# Altium footprint library Custom_Library.PcbLib: 221 footprints (part 7 of 14)
Each footprint in its own frame and in the unit in brackets; x right, y up, seen from the top. Pads: shape width x height; smd on the part's side, far side on the other; paste and mask are expansions set on the pad; w line width, h text height; cw(c..) or ccw(c..) is an arc to the next point about the centre after c.
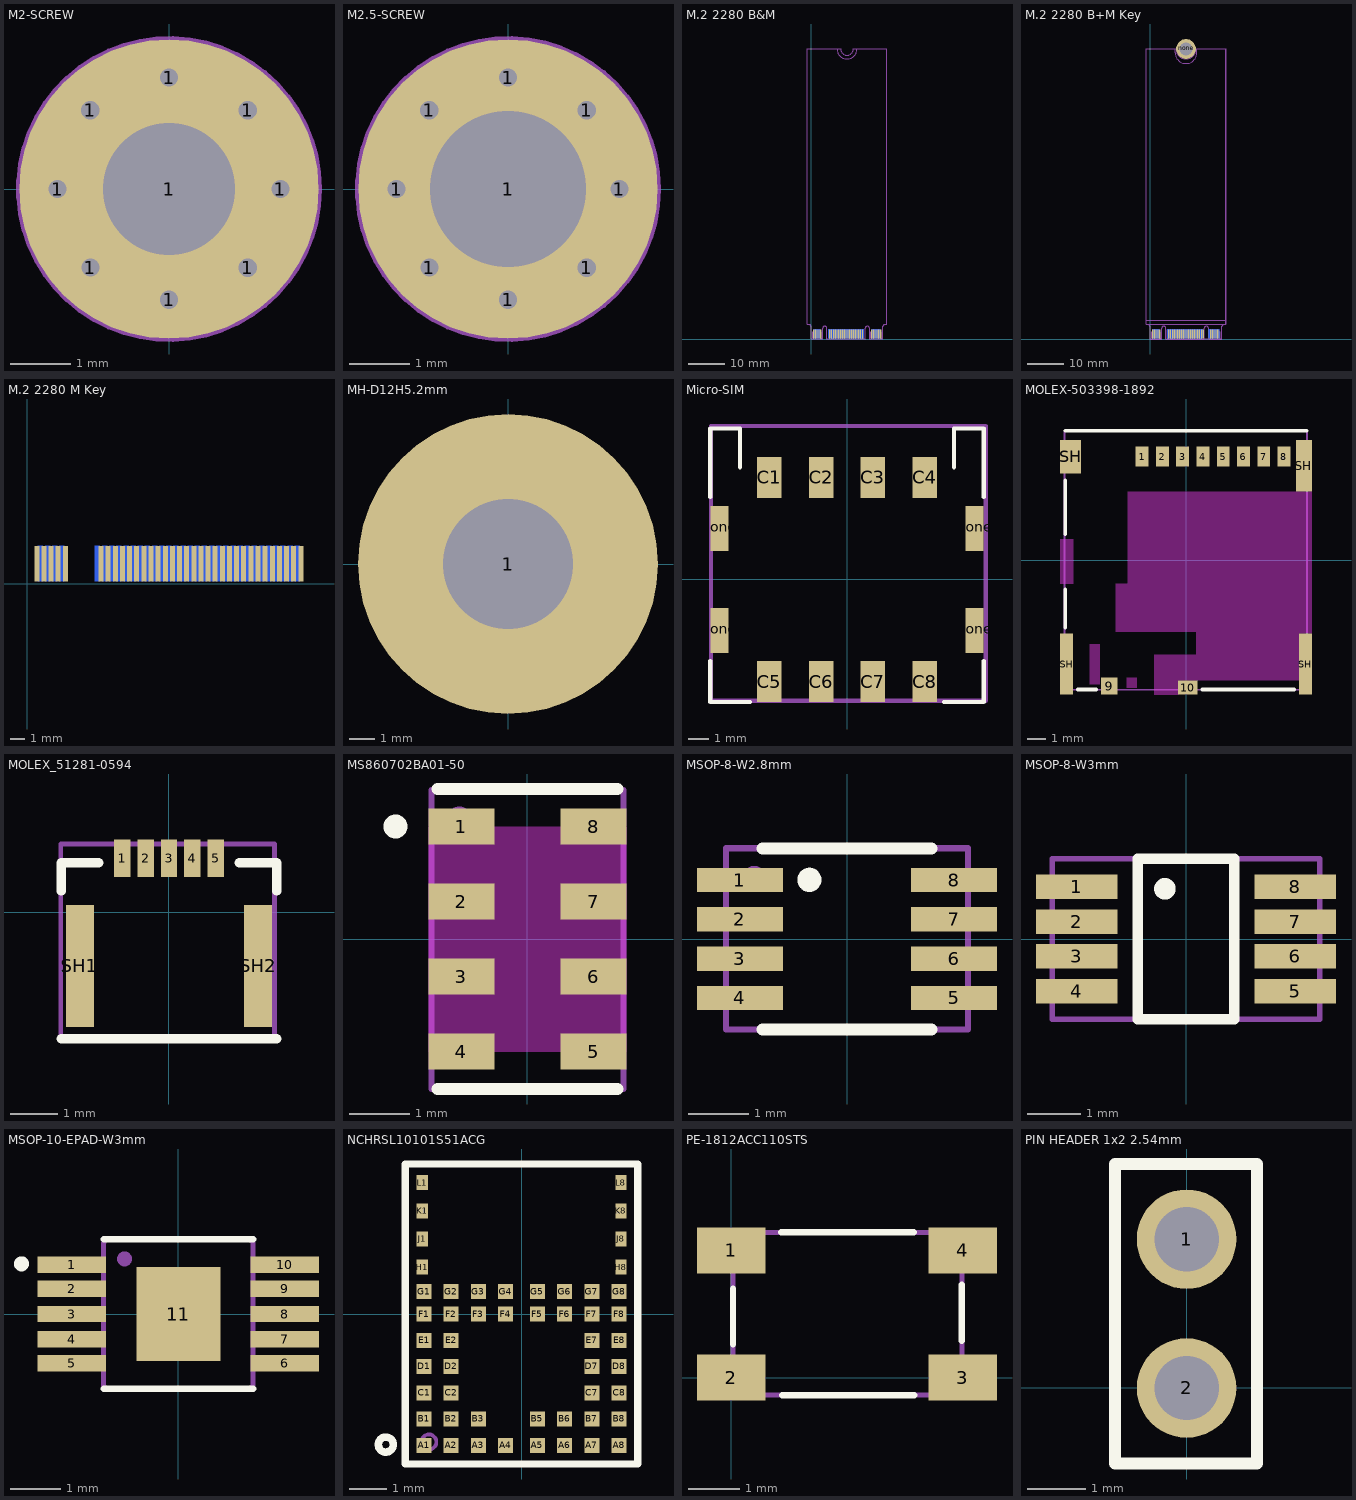
[diagram p6: the footprints below, top view; thin cyan lines are the x and y axes]

## M2-SCREW [mil]
pads (9):
  round 20 hole 12 mask+0: 1(-73.23,0) 1(-51.77,51.77) 1(-51.67,-51.67) 1(0,-72.83) 1(0,73.23) 1(51.78,-51.78) 1(51.78,51.78) 1(73.23,0)
  round 196.85 hole 86.61 mask+0: 1(0,0)
Top Assembly:
  circle w3.94: c0,0 r98.61
  lines w3.94: -98.03,0 0,0 ; 0,-98.43 0,0 ; 0,98.03 0,0 ; 98.61,0 0,0
  text "'.Designator'" at -99.78,-132.6 h39.37

## M2.5-SCREW [mil]
pads (9):
  round 20 hole 12 mask+0: 1(-73.23,0) 1(-51.77,51.77) 1(-51.67,-51.67) 1(0,-72.83) 1(0,73.23) 1(51.78,-51.78) 1(51.78,51.78) 1(73.23,0)
  round 196.85 hole 102.36 mask+0: 1(0,0)
Top Assembly:
  circle w3.94: c0,0 r98.61
  lines w3.94: -98.03,0 0,0 ; 0,-98.43 0,0 ; 0,98.03 0,0 ; 98.61,0 0,0
  text "'.Designator'" at -99.78,-132.6 h39.37

## M.2 2280 B&M [mm]
pads (59):
  rect 0.35x2.5 smd paste+0 mask+0: 1(19.2,1.4) 3(18.675,1.4) 5(18.175,1.4) 7(17.675,1.4) 9(17.175,1.4) 11(16.675,1.4) 21(14.175,1.4) 23(13.675,1.4) 25(13.175,1.4) 27(12.675,1.4) 29(12.175,1.4) 31(11.675,1.4) 33(11.175,1.4) 35(10.675,1.4) 37(10.175,1.4) 39(9.675,1.4) 41(9.175,1.4) 43(8.675,1.4) 45(8.175,1.4) 47(7.675,1.4) 49(7.175,1.4) 51(6.675,1.4) 53(6.175,1.4) 55(5.675,1.4) 57(5.175,1.4) 67(2.675,1.4) 69(2.175,1.4) 71(1.675,1.4) 73(1.175,1.4) 75(0.675,1.4)
  rect 0.35x2.5 smd far side paste+0 mask+0: 2(18.925,1.4) 4(18.425,1.4) 6(17.925,1.4) 8(17.425,1.4) 10(16.925,1.4) 20(14.425,1.4) 22(13.925,1.4) 24(13.425,1.4) 26(12.925,1.4) 28(12.425,1.4) 30(11.925,1.4) 32(11.425,1.4) 34(10.925,1.4) 36(10.425,1.4) 38(9.925,1.4) 40(9.425,1.4) 42(8.925,1.4) 44(8.425,1.4) 46(7.925,1.4) 48(7.425,1.4) 50(6.925,1.4) 52(6.425,1.4) 54(5.925,1.4) 56(5.425,1.4) 58(4.925,1.4) 68(2.425,1.4) 70(1.925,1.4) 72(1.425,1.4) 74(0.925,1.4)
Top Solder:
  region: 19.85,2.752 19.85,0 0,0 0,2.752
Bottom Solder:
  region: 19.85,2.752 19.85,0 0,0 0,2.752
Top Assembly:
  lines w0.1: 7.175,80 ccw(c9.925,80) 12.675,80 ; -1.075,4 -1.075,80 8.175,80 ccw(c9.925,80) 11.675,80 20.925,80 20.925,4 20.35,4 ccw(c20.35,3.5) 19.85,3.5 19.85,0 16.15,0 16.15,2.9 ccw(c15.55,2.9) 14.95,2.9 14.95,0 4.4,0 4.4,2.9 ccw(c3.8,2.9) 3.2,2.9 3.2,0 0,0 0,3.5 ccw(c-0.5,3.5) -0.5,4 -1.075,4 ; 0.5,0.3 0.5,2 0.85,2 0.85,0.3 0.5,0.3 ; 1,0.3 1,2 1.35,2 1.35,0.3 1,0.3 ; 1.5,0.3 1.5,2 1.85,2 1.85,0.3 1.5,0.3 ; 2,0.3 2,2 2.35,2 2.35,0.3 2,0.3 ; 2.5,0.3 2.5,2 2.85,2 2.85,0.3 2.5,0.3 ; 5,0.3 5,2 5.35,2 5.35,0.3 5,0.3 ; 5.5,0.3 5.5,2 5.85,2 5.85,0.3 5.5,0.3 ; 6,0.3 6,2 6.35,2 6.35,0.3 6,0.3 ; 6.5,0.3 6.5,2 6.85,2 6.85,0.3 6.5,0.3 ; 7,0.3 7,2 7.35,2 7.35,0.3 7,0.3 ; 7.5,0.3 7.5,2 7.85,2 7.85,0.3 7.5,0.3 ; 8,0.3 8,2 8.35,2 8.35,0.3 8,0.3 ; 8.5,0.3 8.5,2 8.85,2 8.85,0.3 8.5,0.3 ; 9,0.3 9,2 9.35,2 9.35,0.3 9,0.3 ; 9.5,0.3 9.5,2 9.85,2 9.85,0.3 9.5,0.3 ; 10,0.3 10,2 10.35,2 10.35,0.3 10,0.3 ; 10.5,0.3 10.5,2 10.85,2 10.85,0.3 10.5,0.3 ; 11,0.3 11,2 11.35,2 11.35,0.3 11,0.3 ; 11.5,0.3 11.5,2 11.85,2 11.85,0.3 11.5,0.3 ; 12,0.3 12,2 12.35,2 12.35,0.3 12,0.3 ; 12.5,0.3 12.5,2 12.85,2 12.85,0.3 12.5,0.3 ; 13,0.3 13.35,0.3 13.35,2 13,2 13,0.3 ; 13.5,0.3 13.5,2 13.85,2 13.85,0.3 13.5,0.3 ; 14,0.3 14,2 14.35,2 14.35,0.3 14,0.3 ; 16.5,0.3 16.5,2 16.85,2 16.85,0.3 16.5,0.3 ; 17,0.3 17,2 17.35,2 17.35,0.3 17,0.3 ; 17.5,0.3 17.5,2 17.85,2 17.85,0.3 17.5,0.3 ; 18,0.3 18,2 18.35,2 18.35,0.3 18,0.3 ; 18.5,0.3 18.5,2 18.85,2 18.85,0.3 18.5,0.3 ; 19,0.3 19,2 19.35,2 19.35,0.3 19,0.3

## M.2 2280 B+M Key [mm]
pads (61):
  rect 0.35x2.5 smd far side paste+0 mask+0: 2(18.925,1.4) 4(18.425,1.4) 6(17.925,1.4) 8(17.425,1.4) 10(16.925,1.4) 12(16.425,1.4) 20(14.425,1.4) 22(13.925,1.4) 24(13.425,1.4) 26(12.925,1.4) 28(12.425,1.4) 30(11.925,1.4) 32(11.425,1.4) 34(10.925,1.4) 36(10.425,1.4) 38(9.925,1.4) 40(9.425,1.4) 42(8.925,1.4) 44(8.425,1.4) 46(7.925,1.4) 48(7.425,1.4) 50(6.925,1.4) 52(6.425,1.4) 54(5.925,1.4) 56(5.425,1.4) 58(4.925,1.4) 68(2.425,1.4) 70(1.925,1.4) 72(1.425,1.4) 74(0.925,1.4)
  rect 0.35x2.5 smd paste+0 mask+0: 3(18.675,1.4) 5(18.175,1.4) 7(17.675,1.4) 9(17.175,1.4) 11(16.675,1.4) 19(14.675,1.4) 21(14.175,1.4) 23(13.675,1.4) 25(13.175,1.4) 27(12.675,1.4) 29(12.175,1.4) 31(11.675,1.4) 33(11.175,1.4) 35(10.675,1.4) 37(10.175,1.4) 39(9.675,1.4) 41(9.175,1.4) 43(8.675,1.4) 45(8.175,1.4) 47(7.675,1.4) 49(7.175,1.4) 51(6.675,1.4) 53(6.175,1.4) 55(5.675,1.4) 57(5.175,1.4) 67(2.675,1.4) 69(2.175,1.4) 71(1.675,1.4) 73(1.175,1.4) 75(0.675,1.4)
  round 5.5 hole 3.5: none(9.925,80)
Top Solder:
  region: 19.85,2.752 19.85,0 0,0 0,2.752
Bottom Solder:
  region: 19.85,2.752 19.85,0 0,0 0,2.752
Top 3D Body:
  lines w0.05: -1.075,4 -1.075,80 ; -1.075,4 -0.5,4 cw(c-0.5,3.5) 0,3.5 0,0 3.2,0 3.2,2.9 cw(c3.8,2.9) 4.4,2.9 4.4,0 19.85,0 19.85,3.5 cw(c20.35,3.5) 20.35,4 20.925,4 ; -1.075,4 -1.075,80 ; -1.075,80 8.175,80 ; -1.075,80 8.175,80 ; 8.175,80 ccw(c9.925,80) 11.675,80 ; 11.675,80 20.925,80 ; 11.675,80 20.925,80 ; 20.925,4 20.925,80 ; 20.925,4 20.925,80
Top Assembly:
  lines w0.013: -0.5,4 cw(c-0.5,3.5) 0,3.5 0,0 3.2,0 3.2,2.9 cw(c3.8,2.9) 4.4,2.9 4.4,0 14.95,0 14.95,2.9 cw(c15.55,2.9) 16.15,2.9 16.15,0 19.85,0 19.85,3.5 cw(c20.35,3.5) 20.35,4 ; 7.175,80 ccw(c9.925,80) 12.675,80 ; -1.075,4 -1.075,80 8.175,80 ccw(c9.925,80) 11.675,80 20.925,80 20.925,4 -1.075,4 ; 0.5,0.3 0.85,0.3 0.85,2 0.5,2 0.5,0.3 ; 1,0.3 1.35,0.3 1.35,2 1,2 1,0.3 ; 1.5,0.3 1.85,0.3 1.85,2 1.5,2 1.5,0.3 ; 2,0.3 2,2 2.35,2 2.35,0.3 2,0.3 ; 2.5,0.3 2.5,2 2.85,2 2.85,0.3 2.5,0.3 ; 5,0.3 5.35,0.3 5.35,2 5,2 5,0.3 ; 5.5,0.3 5.85,0.3 5.85,2 5.5,2 5.5,0.3 ; 6,0.3 6.35,0.3 6.35,2 6,2 6,0.3 ; 6.5,0.3 6.85,0.3 6.85,2 6.5,2 6.5,0.3 ; 7,0.3 7,2 7.35,2 7.35,0.3 7,0.3 ; 7.5,0.3 7.5,2 7.85,2 7.85,0.3 7.5,0.3 ; 8,0.3 8.35,0.3 8.35,2 8,2 8,0.3 ; 8.5,0.3 8.5,2 8.85,2 8.85,0.3 8.5,0.3 ; 9,0.3 9,2 9.35,2 9.35,0.3 9,0.3 ; 9.5,0.3 9.5,2 9.85,2 9.85,0.3 9.5,0.3 ; 10,0.3 10.35,0.3 10.35,2 10,2 10,0.3 ; 10.5,0.3 10.85,0.3 10.85,2 10.5,2 10.5,0.3 ; 11,0.3 11,2 11.35,2 11.35,0.3 11,0.3 ; 11.5,0.3 11.85,0.3 11.85,2 11.5,2 11.5,0.3 ; 12,0.3 12.35,0.3 12.35,2 12,2 12,0.3 ; 12.5,0.3 12.85,0.3 12.85,2 12.5,2 12.5,0.3 ; 13,0.3 13.35,0.3 13.35,2 13,2 13,0.3 ; 13.5,0.3 13.5,2 13.85,2 13.85,0.3 13.5,0.3 ; 14,0.3 14.35,0.3 14.35,2 14,2 14,0.3 ; 16.5,0.3 16.85,0.3 16.85,2 16.5,2 16.5,0.3 ; 17,0.3 17.35,0.3 17.35,2 17,2 17,0.3 ; 17.5,0.3 17.5,2 17.85,2 17.85,0.3 17.5,0.3 ; 18,0.3 18.35,0.3 18.35,2 18,2 18,0.3 ; 18.5,0.3 18.85,0.3 18.85,2 18.5,2 18.5,0.3 ; 19,0.3 19,2 19.35,2 19.35,0.3 19,0.3
Bottom Assembly:
  lines w0.013: -1.075,5.2 20.925,5.2 ; 6.925,80 6.925,79 ccw(c9.925,79) 12.925,79 12.925,80 ; -1.075,4 -1.075,80 8.175,80 ccw(c9.925,80) 11.675,80 20.925,80 20.925,4 20.35,4 ccw(c20.35,3.5) 19.85,3.5 19.85,0 16.15,0 16.15,2.9 ccw(c15.55,2.9) 14.95,2.9 14.95,0 4.4,0 4.4,2.9 ccw(c3.8,2.9) 3.2,2.9 3.2,0 0,0 0,3.5 ccw(c-0.5,3.5) -0.5,4 -1.075,4 ; 0.75,0.3 0.75,2.5 1.1,2.5 1.1,0.3 0.75,0.3 ; 1.25,0.3 1.25,2.5 1.6,2.5 1.6,0.3 1.25,0.3 ; 1.75,0.3 2.1,0.3 2.1,2.5 1.75,2.5 1.75,0.3 ; 2.25,0.3 2.25,2.5 2.6,2.5 2.6,0.3 2.25,0.3 ; 4.75,0.3 4.75,2.5 5.1,2.5 5.1,0.3 4.75,0.3 ; 5.25,0.3 5.6,0.3 5.6,2.5 5.25,2.5 5.25,0.3 ; 5.75,0.3 5.75,2.5 6.1,2.5 6.1,0.3 5.75,0.3 ; 6.25,0.3 6.25,2.5 6.6,2.5 6.6,0.3 6.25,0.3 ; 6.75,0.3 6.75,2.5 7.1,2.5 7.1,0.3 6.75,0.3 ; 7.25,0.3 7.25,2.5 7.6,2.5 7.6,0.3 7.25,0.3 ; 7.75,0.3 7.75,2.5 8.1,2.5 8.1,0.3 7.75,0.3 ; 8.25,0.3 8.25,2.5 8.6,2.5 8.6,0.3 8.25,0.3 ; 8.75,0.3 8.75,2.5 9.1,2.5 9.1,0.3 8.75,0.3 ; 9.25,0.3 9.25,2.5 9.6,2.5 9.6,0.3 9.25,0.3 ; 9.75,0.3 9.75,2.5 10.1,2.5 10.1,0.3 9.75,0.3 ; 10.25,0.3 10.25,2.5 10.6,2.5 10.6,0.3 10.25,0.3 ; 10.75,0.3 10.75,2.5 11.1,2.5 11.1,0.3 10.75,0.3 ; 11.25,0.3 11.6,0.3 11.6,2.5 11.25,2.5 11.25,0.3 ; 11.75,0.3 12.1,0.3 12.1,2.5 11.75,2.5 11.75,0.3 ; 12.25,0.3 12.6,0.3 12.6,2.5 12.25,2.5 12.25,0.3 ; 12.75,0.3 12.75,2.5 13.1,2.5 13.1,0.3 12.75,0.3 ; 13.25,0.3 13.6,0.3 13.6,2.5 13.25,2.5 13.25,0.3 ; 13.75,0.3 14.1,0.3 14.1,2.5 13.75,2.5 13.75,0.3 ; 14.25,0.3 14.25,2.5 14.6,2.5 14.6,0.3 14.25,0.3 ; 16.75,0.3 16.75,2.5 17.1,2.5 17.1,0.3 16.75,0.3 ; 17.25,0.3 17.6,0.3 17.6,2.5 17.25,2.5 17.25,0.3 ; 17.75,0.3 18.1,0.3 18.1,2.5 17.75,2.5 17.75,0.3 ; 18.25,0.3 18.25,2.5 18.6,2.5 18.6,0.3 18.25,0.3 ; 18.75,0.3 18.75,2.5 19.1,2.5 19.1,0.3 18.75,0.3

## M.2 2280 M Key [mm]
pads (67):
  rect 0.35x2.5 smd paste+0 mask+0: 1(19.2,1.4) 3(18.675,1.4) 5(18.175,1.4) 7(17.675,1.4) 9(17.175,1.4) 11(16.675,1.4) 13(16.175,1.4) 15(15.675,1.4) 17(15.175,1.4) 19(14.675,1.4) 21(14.175,1.4) 23(13.675,1.4) 25(13.175,1.4) 27(12.675,1.4) 29(12.175,1.4) 31(11.675,1.4) 33(11.175,1.4) 35(10.675,1.4) 37(10.175,1.4) 39(9.675,1.4) 41(9.175,1.4) 43(8.675,1.4) 45(8.175,1.4) 47(7.675,1.4) 49(7.175,1.4) 51(6.675,1.4) 53(6.175,1.4) 55(5.675,1.4) 57(5.175,1.4) 67(2.675,1.4) 69(2.175,1.4) 71(1.675,1.4) 73(1.175,1.4) 75(0.675,1.4)
  rect 0.35x2.5 smd far side paste+0 mask+0: 2(18.925,1.4) 4(18.425,1.4) 6(17.925,1.4) 8(17.425,1.4) 10(16.925,1.4) 12(16.425,1.4) 14(15.925,1.4) 16(15.425,1.4) 18(14.925,1.4) 20(14.425,1.4) 22(13.925,1.4) 24(13.425,1.4) 26(12.925,1.4) 28(12.425,1.4) 30(11.925,1.4) 32(11.425,1.4) 34(10.925,1.4) 36(10.425,1.4) 38(9.925,1.4) 40(9.425,1.4) 42(8.925,1.4) 44(8.425,1.4) 46(7.925,1.4) 48(7.425,1.4) 50(6.925,1.4) 52(6.425,1.4) 54(5.925,1.4) 56(5.425,1.4) 58(4.925,1.4) 68(2.425,1.4) 70(1.925,1.4) 72(1.425,1.4) 74(0.925,1.4)
Top Solder:
  region: 19.85,2.752 19.85,0 0,0 0,2.752
Bottom Solder:
  region: 19.85,2.752 19.85,0 0,0 0,2.752

## MH-D12H5.2mm [mm]
pads (1):
  round 12 hole 5.2 mask+0.5: 1(0,0)

## Micro-SIM [mm]
pads (12):
  rect 1.2x2 smd: C1(-3.81,5) C2(-1.27,5) C3(1.27,5) C4(3.81,5) C5(-3.81,-5) C6(-1.27,-5) C7(1.27,-5) C8(3.81,-5)
  rect 0.9x2.2 smd: none(-6.25,-2.5) none(-6.25,2.5) none(6.25,-2.5) none(6.25,2.5)
Top Overlay:
  lines w0.2: -6.7,-4 -6.7,-6 -4.75,-6 ; -6.7,4.05 -6.7,7.4 -5.25,7.4 -5.25,5.5 ; 4.75,-6 6.7,-6 6.7,-4 ; 5.25,5.5 5.25,7.4 6.7,7.4 6.7,4.05
Top Assembly:
  lines w0.2: -6.663,-5.944 6.797,-5.944 6.797,7.517 -0.336,7.517 -6.663,7.517 -6.663,-5.944
  text "'.Designator'" at -4.97,-0.545 h2
3D body "SIM7050-6-0-00-A.stp": height 2.45, standoff 0, extent -6.63,-5.938 6.78,7.462

## MOLEX-503398-1892 [mm]
pads (14):
  rect 0.7x1.1 smd: 1(-2.38,5.625) 2(-1.28,5.625) 3(-0.18,5.625) 4(0.92,5.625) 5(2.02,5.625) 6(3.12,5.625) 7(4.22,5.625) 8(5.32,5.625)
  rect 0.9x0.93 smd: 9(-4.17,-6.84)
  rect 1.05x0.78 smd: 10(0.095,-6.915)
  rect 0.7x3.33 smd: SH(-6.48,-5.64) SH(6.48,-5.64)
  rect 1.14x1.83 smd: SH(-6.26,5.61)
  rect 0.86x2.8 smd: SH(6.4,5.125)
Top Overlay:
  lines w0.2: -6.55,-3.675 -6.55,-1.575 ; -6.55,1.425 -6.55,4.325 ; -6.55,7.025 6.55,7.025 ; -5.876,-7.025 -4.874,-7.025 ; 0.874,-7.025 5.876,-7.025
Keep-Out Layer:
  region: -6.13,-1.276 -6.836,-1.276 -6.836,1.125 -6.13,1.125
  region: -2.67,-6.93 -3.223,-6.93 -3.223,-6.375 -2.67,-6.375
  region: -4.685,-6.73 -5.239,-6.73 -5.239,-4.575 -4.685,-4.575
  region: -2.67,-6.937 -3.225,-6.937 -3.225,-6.375 -2.67,-6.375
  region: 6.827,-3.975 6.127,-3.975 6.127,-6.526 -0.43,-6.526 -0.43,-7.305 -1.73,-7.305 -1.73,-5.125 0.57,-5.125 0.57,-3.875 -3.82,-3.875 -3.82,-1.275 -3.17,-1.275 -3.17,3.725 6.827,3.725
Top Assembly:
  lines w0.1: -6.599,-7.04 -6.599,7.007 6.563,7.007 6.563,-7.04 -6.599,-7.04
  text "'.Designator'" at -5.403,-0.523 h2
3D body "5033981892--3DModel-STEP-56544.STEP": height 1.4, standoff 0, extent -6.55,-7.025 6.55,7.045

## MOLEX_51281-0594 [mm]
pads (7):
  rect 0.35x0.8 smd: 1(-1,1.15) 2(-0.5,1.15) 3(0,1.15) 4(0.5,1.15) 5(1,1.15)
  rect 0.6x2.6 smd: SH1(-1.9,-1.15) SH2(1.9,-1.15)
Top Overlay:
  lines w0.2: -2.3,-2.7 2.3,-2.7 ; -2.3,0.45 -2.3,1.05 -1.5,1.05 ; 1.5,1.05 2.3,1.05 2.3,0.45
Top Assembly:
  lines w0.1: -2.31,-2.7 -2.31,1.45 2.25,1.45 2.25,-0.06 2.25,-2.7 -0.825,-2.7 -2.31,-2.7
  text "'.Designator'" at -5.013,-4.705 h2
3D body "51281-0594.stp": height 1.2, standoff 0, extent -2.3,-2.6 2.3,1.45

## MS860702BA01-50 [mm]
pads (8):
  rect 1.1x0.6 smd: 1(-1.1,1.875) 2(-1.1,0.625) 3(-1.1,-0.625) 4(-1.1,-1.875) 5(1.1,-1.875) 6(1.1,-0.625) 7(1.1,0.625) 8(1.1,1.875)
Top Overlay:
  circle w0.2: c-2.2,1.875 r0.1
  lines w0.2: -1.5,-2.5 1.5,-2.5 ; -1.5,2.5 1.5,2.5
Keep-Out Layer:
  region: 1.65,-1.875 -1.65,-1.875 -1.65,1.875 1.65,1.875
Top Assembly:
  circle w0.2: c-1.136,2.009 r0.1
  lines w0.1: -1.6,-2.5 -1.6,2.487 -0.467,2.487 1.6,2.487 1.6,-2.5 -1.6,-2.5
  text "'.Designator'" at -4.688,-4.522 h2

## MSOP-8-W2.8mm [mm]
pads (8):
  rect 1.42x0.4 smd: 1(-1.77,0.975) 2(-1.77,0.325) 3(-1.77,-0.325) 4(-1.77,-0.975) 5(1.77,-0.975) 6(1.77,-0.325) 7(1.77,0.325) 8(1.77,0.975)
Top Overlay:
  circle w0.2: c-0.623,0.978 r0.1
  lines w0.2: -1.4,-1.495 1.4,-1.495 ; -1.4,1.495 1.4,1.495
Top Assembly:
  circle w0.2: c-1.53,1.008 r0.1
  lines w0.1: -2,-1.495 -2,1.5 2,1.5 2,-1.495 -2,-1.495
  text "'.Designator'" at -5.243,-3.27 h2
3D body "TXS0102DCTR.STEP": height 1.3, standoff 0, extent -2,-1.475 2,1.475

## MSOP-8-W3mm [mil]
pads (8):
  rect 60x18 smd: 1(-80.5,38.39) 2(-80.5,12.8) 3(-80.5,-12.8) 4(-80.5,-38.39) 5(80.5,-38.39) 6(80.5,-12.8) 7(80.5,12.8) 8(80.5,38.39)
Top Overlay:
  circle w11.81: c-15.54,36.99 r1.97
  lines w7.87: -35.43,-59.06 -35.43,59.06 -23.62,59.06 35.43,59.06 35.43,-59.06 -35.43,-59.06
Top Assembly:
  lines w3.94: -98.43,-59.06 -98.43,59.06 -31.5,59.06 98.43,59.06 98.43,-59.06 -98.43,-59.06
  text "'.Designator'" at -199.1,-135.18 h78.74
3D body "MSOP8_MC_MCH.step": height 43.11, standoff 0, extent -96.49,-59.01 96.5,59.01

## MSOP-10-EPAD-W3mm [mil]
pads (11):
  rect 54x13 smd: 1(-84,39) 2(-84,20) 3(-84,0) 4(-84,-20) 5(-84,-39) 6(84,-39) 7(84,-20) 8(84,0) 9(84,20) 10(84,39)
  rect 66.14x74.02 smd: 11(0,0)
Top Overlay:
  circle w7.87: c-123.8,39.58 r1.97
  lines w5: -59,-59 59,-59 ; -59,59 -12,59 12,59 59,59
Top Assembly:
  drawing of 295 lines, arcs and shapes, not listed
  text "'.Designator'" at -126.77,-104.72 h50
3D body "User_Library-MSOP10-1.STEP": height 43.11, standoff 0, extent -101.37,-62.99 101.38,63

## NCHRSL10101S51ACG [mm]
pads (51):
  rect 0.4x0.4 smd: A1(-2.6,-3.5) A2(-1.875,-3.5) A3(-1.15,-3.5) A4(-0.425,-3.5) A5(0.425,-3.5) A6(1.15,-3.5) A7(1.875,-3.5) A8(2.6,-3.5) B1(-2.6,-2.8) B2(-1.875,-2.8) B3(-1.15,-2.8) B5(0.425,-2.8) B6(1.15,-2.8) B7(1.875,-2.8) B8(2.6,-2.8) C1(-2.6,-2.1) C2(-1.875,-2.1) C7(1.875,-2.1) C8(2.6,-2.1) D1(-2.6,-1.4) D2(-1.875,-1.4) D7(1.875,-1.4) D8(2.6,-1.4) E1(-2.6,-0.7) E2(-1.875,-0.7) E7(1.875,-0.7) E8(2.6,-0.7) F1(-2.6,0) F2(-1.875,0) F3(-1.15,0) F4(-0.425,0) F5(0.425,0) F6(1.15,0) F7(1.875,0) F8(2.6,0) G1(-2.6,0.6) G2(-1.875,0.6) G3(-1.15,0.6) G4(-0.425,0.6) G5(0.425,0.6) G6(1.15,0.6) G7(1.875,0.6) G8(2.6,0.6)
  rect 0.3x0.4 smd: H1(-2.65,1.25) H8(2.65,1.25) J1(-2.65,2) J8(2.65,2) K1(-2.65,2.75) K8(2.65,2.75) L1(-2.65,3.5) L8(2.65,3.5)
Top Overlay:
  circle w0.2: c-3.618,-3.483 r0.2
  lines w0.2: -3.105,-4 -3.105,4 3.097,4 3.097,-4 -3.105,-4
Top Assembly:
  circle w0.1: c-2.471,-3.412 r0.2
  lines w0.1: -3.105,-4 -3.105,4 3.097,4 3.097,-4 -3.105,-4
  text "'.Designator'" at -3.305,-5.505 h1.27
3D body: height 1.46, standoff 0, extent -3,-4 3,4

## PE-1812ACC110STS [mm]
pads (4):
  rect 1.35x0.9 smd: 1(0,2.5) 2(0,0) 3(4.55,0) 4(4.55,2.5)
Top Overlay:
  lines w0.127: 0.033,0.651 0.033,1.751 ; 0.984,2.855 3.584,2.855 ; 0.998,-0.345 3.598,-0.345 ; 4.533,0.725 4.533,1.825
Top Assembly:
  lines w0.1: 0.033,-0.345 4.533,-0.345 4.533,2.855 0.033,2.855 0.033,-0.345
  text "'.Designator'" at -0.816,-2.471 h1.27
3D body: height 3, standoff 0, extent 0.027,-0.336 4.529,2.856

## PIN HEADER 1x2 2.54mm [mm]
pads (2):
  round 1.7 hole 1.1: 1(0,2.54) 2(0,0)
Top Overlay:
  lines w0.2: -1.221,-1.289 -1.221,3.823 1.2,3.823 1.2,-1.289 -1.221,-1.289
Top Assembly:
  lines w0.1: -1.207,-1.297 -1.207,3.817 1.158,3.817 1.158,-1.297 -1.207,-1.297
  text "'.Designator'" at -3.212,-2.878 h1.27